# Altium footprint library Mechanical_Old.PcbLib: 125 footprints (part 2 of 8)
Each footprint in its own frame and in the unit in brackets; x right, y up, seen from the top. Pads: shape width x height; smd on the part's side, far side on the other; paste and mask are expansions set on the pad; w line width, h text height; cw(c..) or ccw(c..) is an arc to the next point about the centre after c.
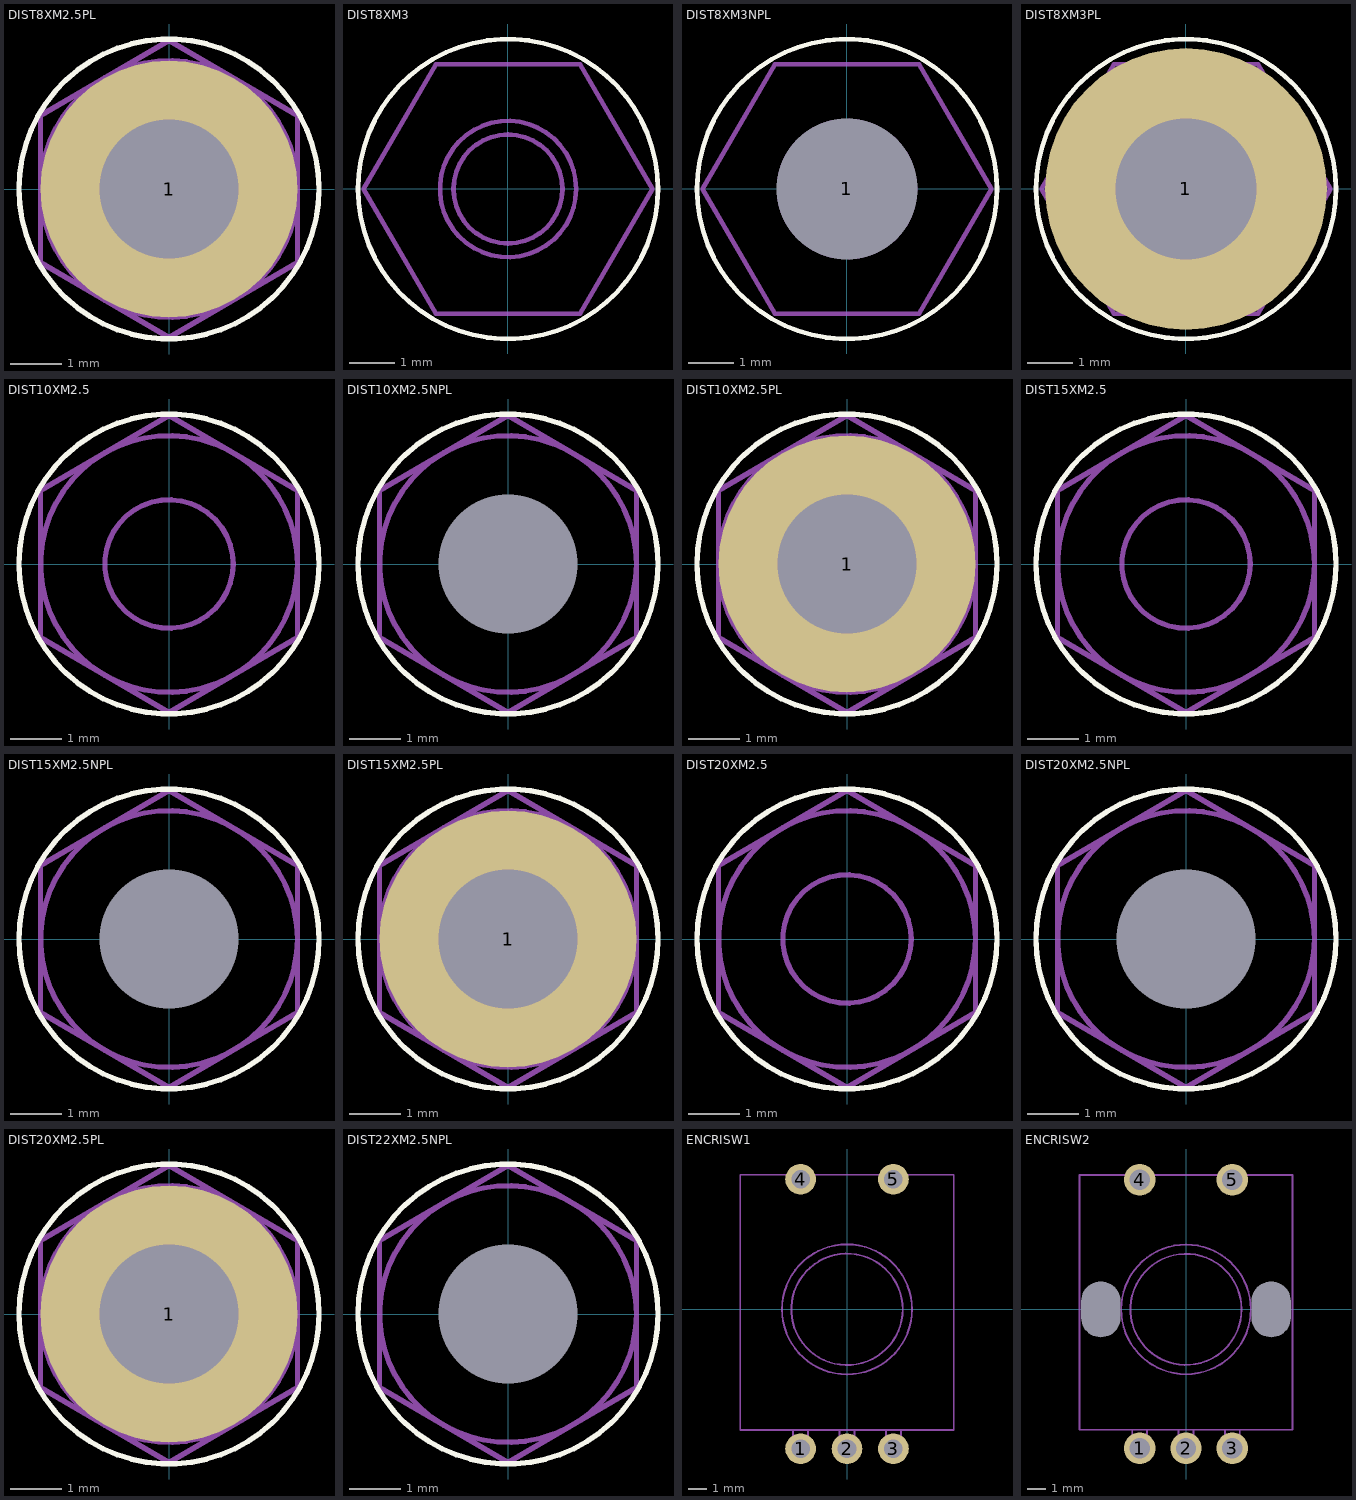
[diagram p1: the footprints below, top view; thin cyan lines are the x and y axes]

## DIST8XM2.5PL [mm] "Standoff SW5mm M2.5 plated hole"
height 8
pads (1):
  round 5 hole 2.7 mask+0.2: 1(0,0)
Top Overlay:
  circle w0.102: c0,0 r2.921
Mechanical 13:
  circle w0.102: c0,0 r2.5
  circle w0.102: c0,0 r1.25
  lines w0.102: -2.5,-1.432 -2.5,1.432 0,2.893 2.5,1.432 2.5,-1.432 0,-2.893 -2.5,-1.432
3D body: height 8, standoff 0, extent -2.5,-2.893 2.5,2.893

## DIST8XM3 [mm] "Standoff SW5.5mm M3 no hole"
height 8
Top Overlay:
  circle w0.102: c0,0 r3.302
Mechanical 13:
  circle w0.1: c0,0 r1.2
  circle w0.1: c0,0 r1.5
  lines w0.1: -3.177,0 -1.589,-2.75 1.589,-2.75 3.177,0 1.589,2.75 -1.589,2.75 -3.177,0 ; -3.177,0 -3.177,0
3D body: height 8, standoff 0, extent -3.177,-2.75 3.177,2.75

## DIST8XM3NPL [mm] "Standoff SW5.5mm M3 nonplated hole"
height 8
pads (1):
  round 3 hole 3.1 unplated mask+1.7: 1(0,0)
Top Overlay:
  circle w0.102: c0,0 r3.302
Mechanical 13:
  circle w0.1: c0,0 r1.5
  circle w0.1: c0,0 r1.2
  lines w0.1: -3.177,0 -1.589,2.75 1.589,2.75 3.177,0 1.589,-2.75 -1.589,-2.75 -3.177,0 ; -3.177,0 -3.177,0
3D body: height 8, standoff 0, extent -3.177,-2.75 3.177,2.75

## DIST8XM3PL [mm] "Standoff SW5.5mm M3 plated hole"
height 8
pads (1):
  round 6.2 hole 3.1: 1(0,0)
Top Overlay:
  circle w0.102: c0,0 r3.302
Mechanical 13:
  circle w0.1: c0,0 r1.2
  circle w0.1: c0,0 r1.5
  lines w0.1: -3.177,0 -1.589,-2.75 1.589,-2.75 3.177,0 1.589,2.75 -1.589,2.75 -3.177,0 ; -3.177,0 -3.177,0
3D body: height 8, standoff 0, extent -3.177,-2.75 3.177,2.75

## DIST10XM2.5 [mm] "Standoff SW5mm M2.5 no hole"
height 10
Top Overlay:
  circle w0.102: c0,0 r2.921
Mechanical 13:
  circle w0.102: c0,0 r2.5
  circle w0.102: c0,0 r1.25
  lines w0.102: -2.5,-1.432 -2.5,1.432 0,2.893 2.5,1.432 2.5,-1.432 0,-2.893 -2.5,-1.432
3D body: height 10, standoff 0, extent -2.5,-2.893 2.5,2.893

## DIST10XM2.5NPL [mm] "Standoff SW5mm M2.5 nonplated hole"
height 10
pads (1):
  round 0 hole 2.7 unplated mask+2.7: 1(0,0)
Top Overlay:
  circle w0.102: c0,0 r2.921
Mechanical 13:
  circle w0.102: c0,0 r2.5
  circle w0.102: c0,0 r1.25
  lines w0.102: -2.5,-1.432 -2.5,1.432 0,2.893 2.5,1.432 2.5,-1.432 0,-2.893 -2.5,-1.432
3D body: height 10, standoff 0, extent -2.5,-2.893 2.5,2.893

## DIST10XM2.5PL [mm] "Standoff SW5mm M2.5 plated hole"
height 10
pads (1):
  round 5 hole 2.7 mask+0.2: 1(0,0)
Top Overlay:
  circle w0.102: c0,0 r2.921
Mechanical 13:
  circle w0.102: c0,0 r2.5
  circle w0.102: c0,0 r1.25
  lines w0.102: -2.5,-1.432 -2.5,1.432 0,2.893 2.5,1.432 2.5,-1.432 0,-2.893 -2.5,-1.432
3D body: height 10, standoff 0, extent -2.5,-2.893 2.5,2.893

## DIST15XM2.5 [mm] "Standoff SW5mm M2.5 no hole"
height 15
Top Overlay:
  circle w0.102: c0,0 r2.921
Mechanical 13:
  circle w0.102: c0,0 r2.5
  circle w0.102: c0,0 r1.25
  lines w0.102: -2.5,-1.432 -2.5,1.432 0,2.893 2.5,1.432 2.5,-1.432 0,-2.893 -2.5,-1.432
3D body: height 15, standoff 0, extent -2.5,-2.893 2.5,2.893

## DIST15XM2.5NPL [mm] "Standoff SW5mm M2.5 nonplated hole"
height 15
pads (1):
  round 0 hole 2.7 unplated mask+2.7: 1(0,0)
Top Overlay:
  circle w0.102: c0,0 r2.921
Mechanical 13:
  circle w0.102: c0,0 r2.5
  circle w0.102: c0,0 r1.25
  lines w0.102: -2.5,-1.432 -2.5,1.432 0,2.893 2.5,1.432 2.5,-1.432 0,-2.893 -2.5,-1.432
3D body: height 15, standoff 0, extent -2.5,-2.893 2.5,2.893

## DIST15XM2.5PL [mm] "Standoff SW5mm M2.5 plated hole"
height 15
pads (1):
  round 5 hole 2.7 mask+0.2: 1(0,0)
Top Overlay:
  circle w0.102: c0,0 r2.921
Mechanical 13:
  circle w0.102: c0,0 r1.25
  circle w0.102: c0,0 r2.5
  lines w0.102: -2.5,-1.432 0,-2.893 2.5,-1.432 2.5,1.432 0,2.893 -2.5,1.432 -2.5,-1.432
3D body: height 15, standoff 0, extent -2.5,-2.893 2.5,2.893

## DIST20XM2.5 [mm] "Standoff SW5mm M2.5 no hole"
height 20
Top Overlay:
  circle w0.102: c0,0 r2.921
Mechanical 13:
  circle w0.102: c0,0 r1.25
  circle w0.102: c0,0 r2.5
  lines w0.102: -2.5,-1.432 0,-2.893 2.5,-1.432 2.5,1.432 0,2.893 -2.5,1.432 -2.5,-1.432
3D body: height 20, standoff 0, extent -2.5,-2.893 2.5,2.893

## DIST20XM2.5NPL [mm] "Standoff SW5mm M2.5 nonplated hole"
height 20
pads (1):
  round 0 hole 2.7 unplated mask+2.7: 1(0,0)
Top Overlay:
  circle w0.102: c0,0 r2.921
Mechanical 13:
  circle w0.102: c0,0 r1.25
  circle w0.102: c0,0 r2.5
  lines w0.102: -2.5,-1.432 0,-2.893 2.5,-1.432 2.5,1.432 0,2.893 -2.5,1.432 -2.5,-1.432
3D body: height 5, standoff 0, extent -2.5,-2.893 2.5,2.893

## DIST20XM2.5PL [mm] "Standoff SW5mm M2.5 plated hole"
height 20
pads (1):
  round 5 hole 2.7 mask+0.2: 1(0,0)
Top Overlay:
  circle w0.102: c0,0 r2.921
Mechanical 13:
  circle w0.102: c0,0 r1.25
  circle w0.102: c0,0 r2.5
  lines w0.102: -2.5,-1.432 0,-2.893 2.5,-1.432 2.5,1.432 0,2.893 -2.5,1.432 -2.5,-1.432
3D body: height 20, standoff 0, extent -2.5,-2.893 2.5,2.893

## DIST22XM2.5NPL [mm] "Standoff SW5mm M2.5 nonplated hole"
height 22
pads (1):
  round 0 hole 2.7 unplated mask+2.7: 1(0,0)
Top Overlay:
  circle w0.102: c0,0 r2.921
Mechanical 13:
  circle w0.102: c0,0 r2.5
  circle w0.102: c0,0 r1.25
  lines w0.102: -2.5,-1.432 -2.5,1.432 0,2.893 2.5,1.432 2.5,-1.432 0,-2.893 -2.5,-1.432
3D body: height 22, standoff 0, extent -2.5,-2.893 2.5,2.893

## ENCRISW1 [mm] "Angular pulse generator Hopt+Schuler DDM427-0/V4"
pads (5):
  round 1.651 hole 1: 1(-2.5,-7.5) 2(0,-7.5) 3(2.5,-7.5) 4(-2.5,7) 5(2.5,7)
Mechanical 13:
  circle w0.1: c0,0 r3
  circle w0.1: c0,0 r3.5
  lines w0.1: -2.9,-6.5 -2.9,-7.5 -2.1,-7.5 -2.1,-6.5 ; -0.4,-6.5 -0.4,-7.5 0.4,-7.5 0.4,-6.5 ; 2.1,-6.5 2.1,-7.5 2.9,-7.5 2.9,-6.5 ; -5.75,-6.5 -5.75,7.25 5.725,7.25 5.75,7.25 5.75,-6.5 -5.75,-6.5

## ENCRISW2 [mm] "Incermental Encoder Type E27"
height 26
pads (7):
  round 1.7 hole 1.1: 1(-2.5,-7.5) 2(0,-7.5) 3(2.5,-7.5) 4(-2.5,7) 5(2.5,7)
  rrect50% 0x0 hole 2.1 slot 3 at 90 deg unplated: MH1(-4.6,0) MH2(4.6,0)
Mechanical 13:
  circle w0.1: c0,0 r3
  circle w0.1: c0,0 r3.5
  lines w0.1: -2.9,-6.5 -2.9,-7.5 -2.1,-7.5 -2.1,-6.5 ; -0.4,-6.5 -0.4,-7.5 0.4,-7.5 0.4,-6.5 ; 2.1,-6.5 2.1,-7.5 2.9,-7.5 2.9,-6.5 ; -5.75,-6.5 -5.75,7.25 5.725,7.25 5.75,7.25 5.75,-6.5 -5.75,-6.5
3D body: height 4, standoff 3, extent 2,-8 3,-6.5
3D body: height 4, standoff 3, extent -0.5,-8 0.5,-6.5
3D body: height 4, standoff 3, extent -3,-8 -2,-6.5
3D body: height 3, standoff -3.3, extent 2.1,6.6 2.9,7.3
3D body: height 3, standoff -3.3, extent -2.9,6.6 -2.1,7.3
3D body: height 3, standoff -3.3, extent 2.1,-7.9 2.9,-7.2
3D body: height 3, standoff -3.3, extent -0.4,-7.9 0.4,-7.2
3D body: height 3, standoff -3.3, extent -2.9,-7.9 -2.1,-7.2
3D body: height 26, standoff 10, extent -3.009,-3.009 3.009,3.009
3D body: height 10, standoff 6.3, extent -3.511,-3.511 3.511,3.511
3D body: height 6.5, standoff 0, extent -5.75,-6.5 5.725,7.25